# Altium footprint library 常用PCB元件库.PcbLib: 71 footprints (part 5 of 5)
Each footprint in its own frame and in the unit in brackets; x right, y up, seen from the top. Pads: shape width x height; smd on the part's side, far side on the other; paste and mask are expansions set on the pad; w line width, h text height; cw(c..) or ccw(c..) is an arc to the next point about the centre after c.
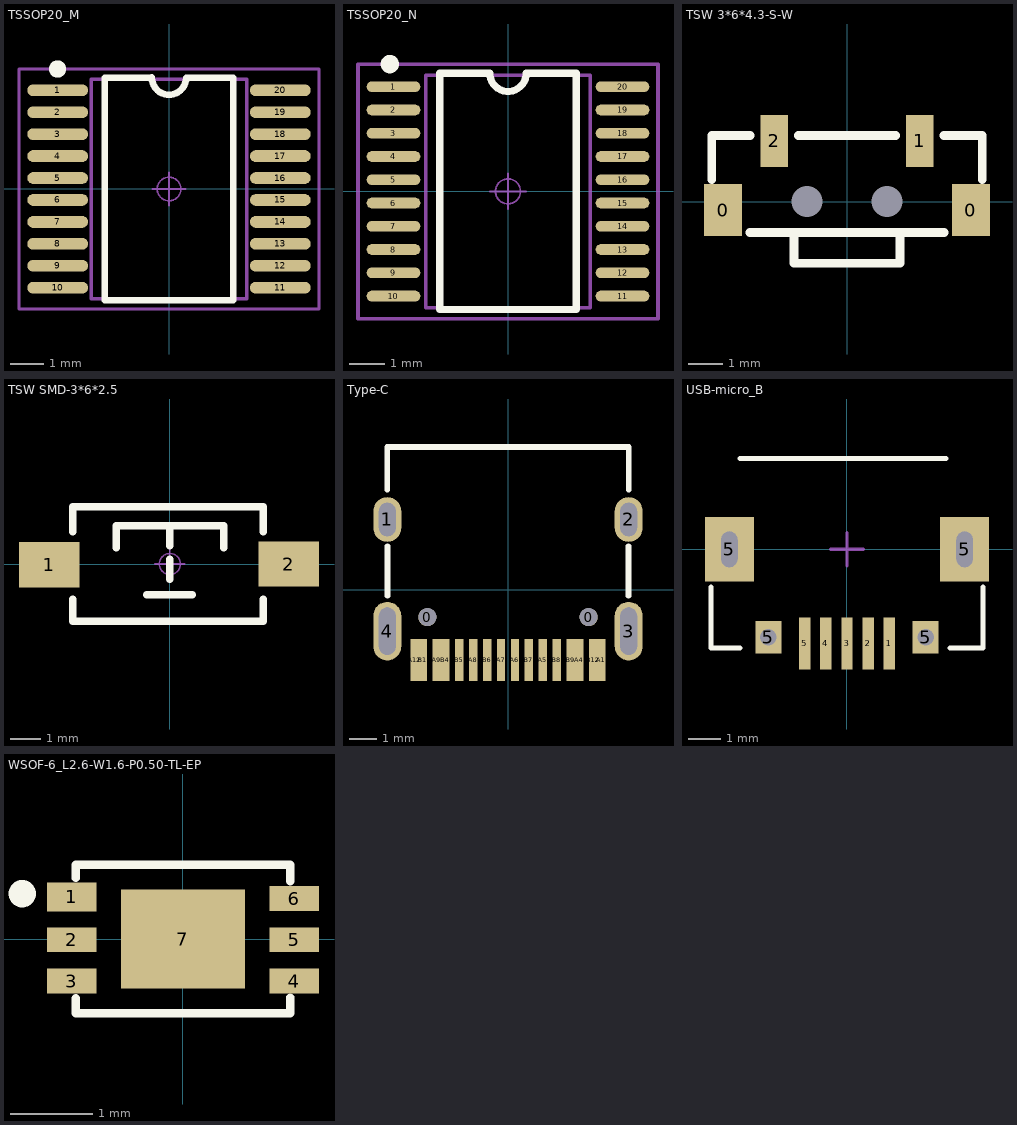
[diagram p4: the footprints below, top view; thin cyan lines are the x and y axes]

## TSSOP20_M [mm] "6.5*6.4*1（长宽高）"
height 1.2
pads (20):
  oval 1.8x0.35 smd: 1(-3.3,2.925) 2(-3.3,2.275) 3(-3.3,1.625) 4(-3.3,0.975) 5(-3.3,0.325) 6(-3.3,-0.325) 7(-3.3,-0.975) 8(-3.3,-1.625) 9(-3.3,-2.275) 10(-3.3,-2.925) 11(3.3,-2.925) 12(3.3,-2.275) 13(3.3,-1.625) 14(3.3,-0.975) 15(3.3,-0.325) 16(3.3,0.325) 17(3.3,0.975) 18(3.3,1.625) 19(3.3,2.275) 20(3.3,2.925)
Top Overlay:
  circle w0.254: c-3.302,3.556 r0.13
  lines w0.2: -1.905,-3.3 -1.905,3.299 -0.508,3.302 ccw(c0,3.3) 0.508,3.3 1.905,3.3 1.905,-3.3 -1.905,-3.3
Mechanical 13:
  lines w0.1: -2.3,-3.25 -2.3,3.25 2.3,3.25 2.3,-3.25 -2.3,-3.25
Mechanical 15:
  circle w0.05: c0,0 r0.35
  lines w0.05: -0.5,0 0.5,0 ; 0,-0.5 0,0.5
  lines w0.1: -4.445,-3.556 4.445,-3.556 4.445,3.556 -4.445,3.556 -4.445,-3.556
3D body "TSSOP20.STEP": height 1.03, standoff -0.02, extent -3.202,-3.25 3.202,3.25

## TSSOP20_N [mm] "6.5*6.4*1（长宽高）"
height 1.2
pads (20):
  oval 1.5x0.3 smd: 1(-3.2,2.925) 2(-3.2,2.275) 3(-3.2,1.625) 4(-3.2,0.975) 5(-3.2,0.325) 6(-3.2,-0.325) 7(-3.2,-0.975) 8(-3.2,-1.625) 9(-3.2,-2.275) 10(-3.2,-2.925) 11(3.2,-2.925) 12(3.2,-2.275) 13(3.2,-1.625) 14(3.2,-0.975) 15(3.2,-0.325) 16(3.2,0.325) 17(3.2,0.975) 18(3.2,1.625) 19(3.2,2.275) 20(3.2,2.925)
Top Overlay:
  circle w0.254: c-3.302,3.556 r0.13
  lines w0.2: -1.905,-3.3 -1.905,3.299 -0.508,3.302 ccw(c0,3.3) 0.508,3.3 1.905,3.3 1.905,-3.3 -1.905,-3.3
Mechanical 13:
  lines w0.1: -2.3,-3.25 -2.3,3.25 2.3,3.25 2.3,-3.25 -2.3,-3.25
Mechanical 15:
  circle w0.05: c0,0 r0.35
  lines w0.05: -0.5,0 0.5,0 ; 0,-0.5 0,0.5
  lines w0.1: -4.191,-3.556 4.191,-3.556 4.191,3.556 -4.191,3.556 -4.191,-3.556
3D body "TSSOP20.STEP": height 1.03, standoff -0.02, extent -3.202,-3.25 3.202,3.25

## TSW 3*6*4.3-S-W [mm] "侧立贴片3*6*4.3"
pads (6):
  rect 1.1x1.5 smd: 0(-3.575,-0.25) 0(3.575,-0.25)
  round 0 hole 0.9: 0(-1.15,0) 0(1.15,0)
  rect 0.8x1.5 smd: 1(2.1,1.75) 2(-2.1,1.75)
Top Overlay:
  lines w0.254: -3.9,0.635 -3.9,1.9 -3.895,1.905 -2.794,1.905 ; -2.794,-0.889 2.794,-0.889 ; -1.524,-0.889 -1.524,-1.778 1.524,-1.778 1.524,-0.889 ; -1.397,1.905 1.397,1.905 ; 2.794,1.905 3.895,1.905 3.9,1.91 3.9,0.635
3D body "TSW 3x6x4.3-S-W.STEP": height 3.51, standoff -0.74, extent -3.9,-1.79 3.9,1.91

## TSW SMD-3*6*2.5 [mm] "3*6*2.5mm"
pads (2):
  rect 2x1.5 smd: 1(-3.996,-0.02) 2(3.937,0)
Top Overlay:
  lines w0.254: -3.212,-1.168 -3.212,-1.9 3.088,-1.9 3.088,-1.168 ; -3.212,1.067 -3.212,1.9 3.088,1.9 3.088,1.067 ; -1.778,0.533 -1.778,1.27 1.778,1.27 1.778,0.533 ; -0.762,-1.016 0.737,-1.016 ; 0,-0.508 0,0.152 ; 0,0.61 0,1.27
Mechanical 15:
  circle w0.05: c0,0 r0.35
  lines w0.05: -0.5,0 0.5,0 ; 0,-0.5 0,0.5
3D body "TSW SMD-3x6x2.5.STEP": height 2.59, standoff -0.03, extent -4,-1.75 4,1.75

## Type-C [mm]
pads (22):
  round 0.65 hole 0.65: 0(-2.89,-0.98) 0(2.89,-0.98)
  oval 1x1.6 hole 0.6 slot 1.2 at 90 deg: 1(-4.325,2.52) 2(4.325,2.52)
  oval 1x2.1 hole 0.6 slot 1.7 at 90 deg: 3(4.325,-1.48) 4(-4.325,-1.48)
  rect 0.3x1.5 smd: A1(3.35,-2.52) A4(2.55,-2.52) A5(1.25,-2.52) A6(0.25,-2.52) A7(-0.25,-2.52) A8(-1.25,-2.52) A9(-2.55,-2.52) A12(-3.35,-2.52) B1(-3.05,-2.52) B4(-2.25,-2.52) B5(-1.75,-2.52) B6(-0.75,-2.52) B7(0.75,-2.52) B8(1.75,-2.52) B9(2.25,-2.52) B12(3.05,-2.52)
Top Overlay:
  lines w0.203: -4.325,3.592 -4.325,5.12 4.325,5.12 4.325,3.592 ; -4.318,-0.218 -4.318,1.56 ; 4.318,-0.218 4.318,1.56
3D body "User Library-USB - C.step": height 3.26, standoff -1, extent -4.505,-2.478 4.445,5.272

## USB-micro_B [mm] "micro型USB ，5.7*7.8*2.5mm"
pads (9):
  rect 0.35x1.6 smd: 1(1.3,-2.9) 2(0.65,-2.9) 3(0,-2.9) 4(-0.65,-2.9) 5(-1.3,-2.9)
  rect 1.5x2 hole 0.5 slot 1.1 at 90 deg: 5(-3.625,0) 5(3.625,0)
  rect 0.8x1 hole 0.5: 5(-2.425,-2.71) 5(2.425,-2.71)
Top Overlay:
  lines w0.152: -4.191,-1.168 -4.191,-3.048 -3.302,-3.048 ; -3.302,2.794 3.048,2.794 ; 3.175,-3.048 4.191,-3.048 4.191,-1.168
Mechanical 15:
  lines w0.1: -0.508,0 0.508,0 ; 0,-0.508 0,0.508
3D body "USB micro_A.STEP": height 2.8, standoff -0.95, extent -4.001,-2.89 4.001,2.71

## WSOF-6_L2.6-W1.6-P0.50-TL-EP [mm]
pads (7):
  rect 0.599x0.351 smd: 1(-1.35,0.511)
  rect 0.6x0.3 smd: 2(-1.35,-0.01) 3(-1.35,-0.511)
  rect 0.599x0.3 smd: 4(1.35,-0.51) 5(1.35,-0.01) 6(1.35,0.49)
  rect 1.5x1.2 smd: 7(0,0)
Top Overlay:
  circle w0.25: c-1.95,0.55 r0.04
  lines w0.102: -1.3,-0.88 -1.3,-0.72 ; -1.3,0.74 -1.3,0.9 1.3,0.9 1.3,0.7 ; 1.3,-0.71 1.3,-0.9 -1.3,-0.9 ; -1.3,-0.9 -1.3,-0.9
3D body "User Library-BH1750FVI-1.step": height 0.75, standoff -0.01, extent -1.5,-0.8 1.5,0.8